# Altium footprint library Sajad_Altium_Library.PcbLib: 380 footprints (part 20 of 24)
Each footprint in its own frame and in the unit in brackets; x right, y up, seen from the top. Pads: shape width x height; smd on the part's side, far side on the other; paste and mask are expansions set on the pad; w line width, h text height; cw(c..) or ccw(c..) is an arc to the next point about the centre after c.
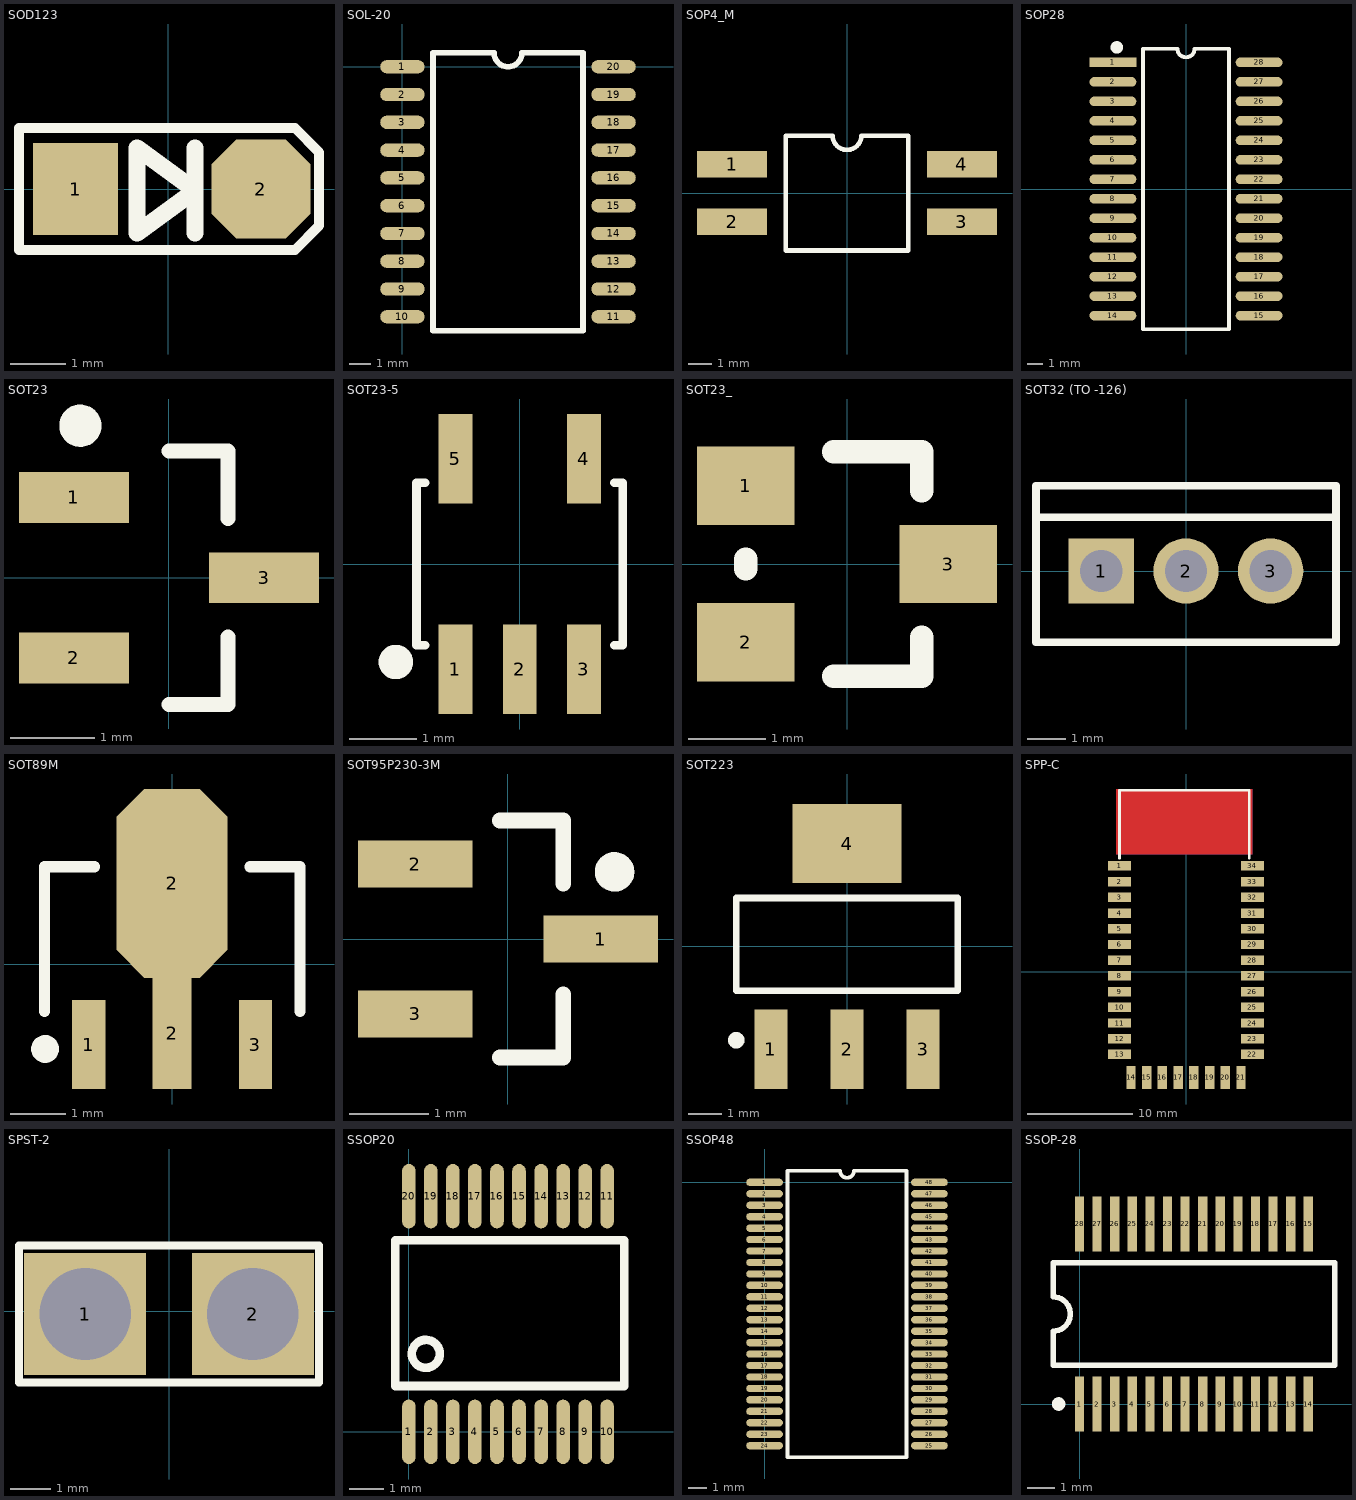
[diagram p19: the footprints below, top view; thin cyan lines are the x and y axes]

## SOD123 [mil] "Sod123"
pads (2):
  rect 60x65 smd: 1(-65.5,0)
  oct 70x70 smd: 2(65.5,0)
Top Overlay:
  lines w7: -105.5,-43 -105.5,43 37.5,43 89.5,43 106.5,26 106.5,-26 89.5,-43 37.5,-43 -105.5,-43
  lines w12: 19,-31 19,29 ; -22,-31 19,-1 -22,29 -22,-31
3D body: height 50, standoff 0, extent -72.83,-31.49 72.84,31.5

## SOL-20 [mil]
pads (20):
  oval 80x24 smd: 1(0,0) 2(0,-50) 3(0,-100) 4(0,-150) 5(0,-200) 6(0,-250) 7(0,-300) 8(0,-350) 9(0,-400) 10(0,-450) 11(380,-450) 12(380,-400) 13(380,-350) 14(380,-300) 15(380,-250) 16(380,-200) 17(380,-150) 18(380,-100) 19(380,-50) 20(380,0)
Top Overlay:
  lines w10: 55,-475 55,25 165,25 ccw(c190,25) 215,25 325,25 325,-475 55,-475

## SOP4_M [mm] "c"
pads (4):
  rect 3.048x1.143 smd: 1(-5,1.25) 2(-5,-1.25) 3(5,-1.25) 4(5,1.25)
Top Overlay:
  lines w0.2: -2.665,-2.5 -2.665,2.5 -0.625,2.5 ccw(c0,2.5) 0.625,2.5 2.665,2.5 2.665,-2.5 -2.665,-2.5
3D body: height 3.83, standoff 0.08, extent -4.288,-2.29 4.289,2.29

## SOP28 [mil] "SOP28, 28-Leads"
height 47.24
pads (28):
  rect 120x25 smd: 1(-187.5,325)
  oval 120x25 smd: 2(-187.5,275) 3(-187.5,225) 4(-187.5,175) 5(-187.5,125) 6(-187.5,75) 7(-187.5,25) 8(-187.5,-25) 9(-187.5,-75) 10(-187.5,-125) 11(-187.5,-175) 12(-187.5,-225) 13(-187.5,-275) 14(-187.5,-325) 15(187.5,-325) 16(187.5,-275) 17(187.5,-225) 18(187.5,-175) 19(187.5,-125) 20(187.5,-75) 21(187.5,-25) 22(187.5,25) 23(187.5,75) 24(187.5,125) 25(187.5,175) 26(187.5,225) 27(187.5,275) 28(187.5,325)
Top Overlay:
  circle w16: c-177.5,363.54 r8
  lines w10: -110,-360 110,-360 110,360 22,360 cw(c0,360) -22,360 -110,360 -110,-360

## SOT23 [mm]
pads (3):
  rect 1.3x0.6 smd: 1(-1.126,0.95) 2(-1.126,-0.95) 3(1.126,0)
Top Overlay:
  circle w0.25: c-1.05,1.8 r0.125
  lines w0.178: 0,-1.5 0.7,-1.5 0.7,-0.7 ; 0,1.5 0.7,1.5 0.7,0.7
3D body: height 1, standoff -0.1, extent -1.569,-1.5 1.569,1.5

## SOT23-5 [mm]
pads (5):
  rect 0.5x1.321 smd: 1(-0.95,-1.556) 2(0,-1.556) 3(0.95,-1.556) 4(0.95,1.556) 5(-0.95,1.556)
Top Overlay:
  circle w0.254: c-1.829,-1.448 r0.127
  lines w0.127: -1.397,-1.2 -1.524,-1.2 -1.524,0 -1.524,1.2 -1.397,1.2 ; 1.397,-1.2 1.524,-1.2 1.524,0 1.524,1.2 1.397,1.2
3D body: height 1.3, standoff 0, extent -1.5,-1.5 1.5,1.5

## SOT23_ [mil]
pads (3):
  rect 50x40 smd: 1(-51.75,40) 2(-51.75,-40) 3(51.75,0)
Top Overlay:
  lines w12: -51.75,-2.5 -51.75,2.5 ; -6.75,-57.5 38.25,-57.5 38.25,-37.5 ; -6.75,57.5 38.25,57.5 38.25,37.5
3D body: height 39.37, standoff -3.94, extent -61.76,-59.06 61.77,59.05

## SOT32 (TO -126) [mm] "SIP with Mounting Hole; 3 Leads; Body 10.7 x 7.6 x 2.6 mm (typ); Pitch 2.2 mm"
height 13.4
pads (3):
  rect 1.7x1.7 hole 1.1: 1(-2.2,0)
  round 1.7 hole 1.1: 2(0,0) 3(2.2,0)
Top Overlay:
  lines w0.2: -3.9,1.401 3.9,1.401 ; -3.9,-1.85 3.9,-1.85 3.9,1.4 3.9,2.214 -3.9,2.214 -3.9,1.4 -3.9,-1.85
3D body: height 15.6, standoff -2.35, extent -3.848,-1.456 3.952,1.244

## SOT89M [mm] "SOT89, 3-Leads, Body 4.5x2.4 mm, Pitch 1.5mm, Lead Span 4.1mm, IPC Low Density"
height 1.6
pads (4):
  rect 0.6x1.6 smd: 1(-1.5,-1.45) 3(1.5,-1.45)
  rect 0.7x2 smd: 2(0,-1.25)
  oct 2x3.4 smd: 2(0,1.45)
Top Overlay:
  circle w0.25: c-2.286,-1.529 r0.125
  lines w0.2: -2.3,-0.85 -2.3,1.75 -1.4,1.75 ; 1.4,1.75 2.3,1.75 2.3,-0.85
3D body: height 1.51, standoff 0, extent -2.25,-1.6 2.25,2.7

## SOT95P230-3M [mm] "SOT23, 3-Leads, Body 2.9x1.3mm, Pitch 0.95mm, Lead Span 2.3mm - Alternate Lead Configuration, IPC Low Density"
height 1.1
pads (3):
  rect 1.45x0.6 smd: 1(1.175,0) 2(-1.175,0.95) 3(-1.175,-0.95)
Top Overlay:
  circle w0.25: c1.35,0.85 r0.125
  lines w0.2: -0.1,-1.5 0.7,-1.5 0.7,-0.7 ; -0.1,1.5 0.7,1.5 0.7,0.7
3D body: height 1.1, standoff 0, extent -1.635,-1.5 1.503,1.5

## SOT223 [mm]
pads (4):
  rect 1x2.4 smd: 1(-2.3,-3.111) 2(0,-3.111) 3(2.3,-3.111)
  rect 3.3x2.4 smd: 4(0,3.111)
Top Overlay:
  circle w0.25: c-3.35,-2.836 r0.125
  lines w0.2: -3.35,-1.336 3.35,-1.336 3.35,1.463 -3.35,1.463 -3.35,-1.336
3D body: height 1.59, standoff -0.06, extent -3.25,-3.437 3.25,3.563

## SPP-C [mm] "Bluetooth module footprint"
height 1.7
pads (34):
  rect 2.2x0.9 smd: 1(-6.35,10.1) 2(-6.35,8.6) 3(-6.35,7.1) 4(-6.35,5.6) 5(-6.35,4.1) 6(-6.35,2.6) 7(-6.35,1.1) 8(-6.35,-0.4) 9(-6.35,-1.9) 10(-6.35,-3.4) 11(-6.35,-4.9) 12(-6.35,-6.4) 13(-6.35,-7.9) 22(6.35,-7.9) 23(6.35,-6.4) 24(6.35,-4.9) 25(6.35,-3.4) 26(6.35,-1.9) 27(6.35,-0.4) 28(6.35,1.1) 29(6.35,2.6) 30(6.35,4.1) 31(6.35,5.6) 32(6.35,7.1) 33(6.35,8.6) 34(6.35,10.1)
  rect 0.9x2.2 smd: 14(-5.25,-10.1) 15(-3.75,-10.1) 16(-2.25,-10.1) 17(-0.75,-10.1) 18(0.75,-10.1) 19(2.25,-10.1) 20(3.75,-10.1) 21(5.25,-10.1)
Top Layer:
  pour cut-out: -6.654,17.449 6.346,17.449 6.346,11.226 -6.654,11.226
Bottom Layer:
  pour cut-out: -6.654,17.449 6.346,17.449 6.346,11.226 -6.654,11.226
Top Overlay:
  lines w0.254: -6.35,10.82 -6.35,17.322 6.043,17.322 6.043,10.848
3D body: height 4.31, standoff 0, extent -6.5,-9.69 6.5,17.31

## SPST-2 [mil]
pads (2):
  rect 120x120 hole 90: 1(-82.5,-2.5) 2(82.5,-2.5)
Top Overlay:
  lines w7.87: 146,-70 -147.5,-70 -147.5,65 146,65 ; 147.5,-70 147.5,65

## SSOP20 [mm]
pads (20):
  oval 0.4x1.9 smd: 1(0,0) 2(0.65,0) 3(1.3,0) 4(1.95,0) 5(2.6,0) 6(3.25,0) 7(3.9,0) 8(4.55,0) 9(5.2,0) 10(5.85,0) 11(5.85,6.95) 12(5.2,6.95) 13(4.55,6.95) 14(3.9,6.95) 15(3.25,6.95) 16(2.6,6.95) 17(1.95,6.95) 18(1.3,6.95) 19(0.65,6.95) 20(0,6.95)
Top Overlay:
  circle w0.254: c0.5,2.3 r0.412
  lines w0.254: -0.4,1.35 6.35,1.35 6.35,5.65 -0.4,5.65 -0.4,1.35

## SSOP48 [mil]
pads (48):
  oval 80x16 smd: 1(0,0) 2(0,-25) 3(0,-50) 4(0,-75) 5(0,-100) 6(0,-125) 7(0,-150) 8(0,-175) 9(0,-200) 10(0,-225) 11(0,-250) 12(0,-275) 13(0,-300) 14(0,-325) 15(0,-350) 16(0,-375) 17(0,-400) 18(0,-425) 19(0,-450) 20(0,-475) 21(0,-500) 22(0,-525) 23(0,-550) 24(0,-575) 25(360,-575) 26(360,-550) 27(360,-525) 28(360,-500) 29(360,-475) 30(360,-450) 31(360,-425) 32(360,-400) 33(360,-375) 34(360,-350) 35(360,-325) 36(360,-300) 37(360,-275) 38(360,-250) 39(360,-225) 40(360,-200) 41(360,-175) 42(360,-150) 43(360,-125) 44(360,-100) 45(360,-75) 46(360,-50) 47(360,-25) 48(360,0)
Top Overlay:
  lines w8: 50,-600 50,25 165,25 ccw(c180,25) 195,25 310,25 310,-600 50,-600

## SSOP-28 [mm]
pads (28):
  rect 0.34x2.05 smd: 1(0,0) 2(0.65,0) 3(1.3,0) 4(1.95,0) 5(2.6,0) 6(3.25,0) 7(3.9,0) 8(4.55,0) 9(5.2,0) 10(5.85,0) 11(6.5,0) 12(7.15,0) 13(7.8,0) 14(8.45,0) 15(8.45,6.65) 16(7.8,6.65) 17(7.15,6.65) 18(6.5,6.65) 19(5.85,6.65) 20(5.2,6.65) 21(4.55,6.65) 22(3.9,6.65) 23(3.25,6.65) 24(2.6,6.65) 25(1.95,6.65) 26(1.3,6.65) 27(0.65,6.65) 28(0,6.65)
Top Overlay:
  circle w0.25: c-0.775,0 r0.125
  lines w0.2: -0.975,1.425 -0.975,2.692 ccw(c-0.975,3.325) -0.975,3.958 -0.975,5.225 9.425,5.225 9.425,1.425 -0.975,1.425